# Altium footprint library 辉光_PCBLib.PcbLib: 45 footprints (part 3 of 3)
Each footprint in its own frame and in the unit in brackets; x right, y up, seen from the top. Pads: shape width x height; smd on the part's side, far side on the other; paste and mask are expansions set on the pad; w line width, h text height; cw(c..) or ccw(c..) is an arc to the next point about the centre after c.
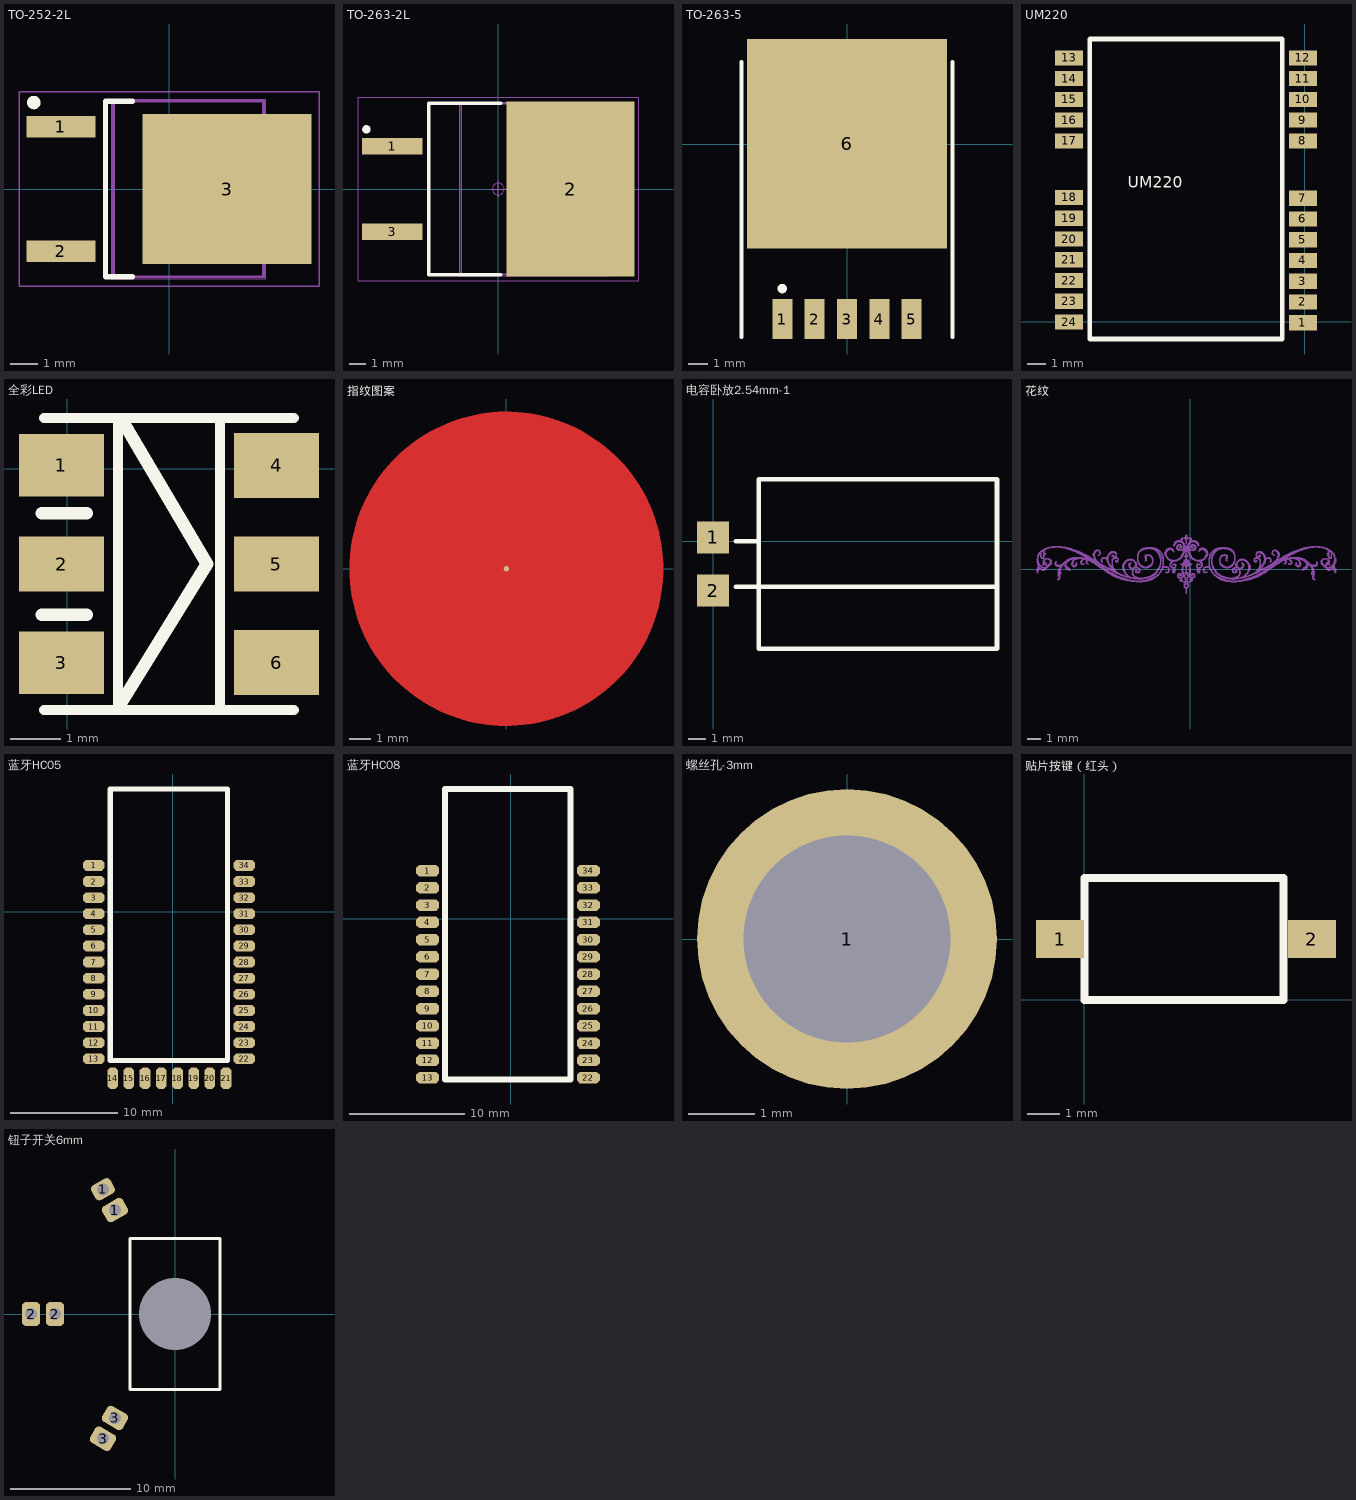
[diagram p2: the footprints below, top view; thin cyan lines are the x and y axes]

## TO-252-2L [mm]
pads (3):
  rect 2.55x0.8 smd: 1(-4,2.3) 2(-4,-2.3)
  rect 6.25x5.55 smd: 3(2.15,0)
Top Overlay:
  circle w0.25: c-5,3.2 r0.125
  lines w0.2: -1.35,-3.25 -2.35,-3.25 -2.35,3.25 -1.35,3.25
Mechanical 15:
  lines w0.1: 3.5,-2.668 3.946,-2.668 4.85,-1.666 4.85,1.666 3.946,2.668 3.5,2.668 ; -2.05,-3.25 3.5,-3.25 3.5,3.25 -2.05,3.25 -2.05,-3.25
Mechanical 16:
  circle w0.05: c0,0 r0.35
  lines w0.001: -2.125,-3.325 3.575,-3.325 3.575,3.325 -2.125,3.325 -2.125,-3.325
  lines w0.05: -0.5,0 0.5,0 ; 0,-0.5 0,0.5 ; -5.55,-3.6 5.55,-3.6 5.55,3.6 -5.55,3.6 -5.55,-3.6

## TO-263-2L [mm]
height 1.4
pads (3):
  rect 3.6x1 smd: 1(-6.3,2.54) 3(-6.3,-2.54)
  rect 7.6x10.4 smd: 2(4.3,0)
Top Overlay:
  circle w0.25: c-7.85,3.55 r0.125
  lines w0.2: 0.15,-5.1 -4.15,-5.1 -4.15,5.1 0.15,5.1
Mechanical 15:
  lines w0.1: 6.49,-5.08 -2.21,-5.08 -2.21,5.08 6.49,5.08 ; 6.49,-5.08 6.49,5.08 ; 6.49,-5.08 6.86,-5.08 7.61,-4.249 7.61,4.249 6.86,5.08 6.49,5.08
Mechanical 16:
  circle w0.05: c0,0 r0.35
  lines w0.001: -2.31,-5.155 6.59,-5.155 6.59,5.155 -2.31,5.155 -2.31,-5.155
  lines w0.05: -0.5,0 0.5,0 ; 0,-0.5 0,0.5 ; -8.35,-5.45 8.35,-5.45 8.35,5.45 -8.35,5.45 -8.35,-5.45

## TO-263-5 [mm]
pads (6):
  rect 1.05x2.1 smd: 1(-3.4,-9.178) 2(-1.7,-9.178) 3(0,-9.178) 4(1.7,-9.178) 5(3.4,-9.178)
  rect 10.5x11 smd: 6(0,0.034)
Top Overlay:
  circle w0.25: c-3.4,-7.578 r0.125
  lines w0.2: -5.55,-10.128 -5.55,4.322 ; 5.55,-10.128 5.55,4.322
3D body: height 0.6, standoff 0, extent 2.921,-9.652 3.81,-5.461
3D body: height 0.6, standoff 0, extent 1.27,-9.652 2.159,-5.461
3D body: height 0.6, standoff 0, extent -0.508,-9.652 0.381,-5.461
3D body: height 0.6, standoff 0, extent -2.159,-9.652 -1.27,-5.461
3D body: height 0.6, standoff 0, extent -3.81,-9.652 -2.921,-5.461
3D body: height 1, standoff 0, extent -5.334,4.318 5.334,5.334
3D body: height 3, standoff 0, extent -5.334,-5.461 5.334,4.318

## UM220 [mm]
pads (24):
  rect 1.5x0.8 smd: 1(-0.092,-0.062) 2(-0.092,1.038) 3(-0.092,2.138) 4(-0.092,3.238) 5(-0.092,4.338) 6(-0.092,5.438) 7(-0.092,6.538) 8(-0.09,9.576) 9(-0.09,10.676) 10(-0.09,11.776) 11(-0.09,12.876) 12(-0.09,13.976) 13(-12.49,13.976) 14(-12.49,12.876) 15(-12.49,11.776) 16(-12.49,10.676) 17(-12.49,9.576) 18(-12.49,6.576) 19(-12.49,5.476) 20(-12.49,4.376) 21(-12.49,3.276) 22(-12.49,2.176) 23(-12.49,1.076) 24(-12.49,-0.024)
Top Overlay:
  lines w0.254: -11.39,-0.924 -1.19,-0.924 -1.19,14.976 -11.39,14.976 -11.39,-0.924
  text "UM220" at -9.39,6.876 h1.02

## 全彩LED [mm]
pads (6):
  rect 1.7x1.25 smd: 1(-0.118,0.07) 3(-0.118,-3.88)
  rect 1.7x1.1 smd: 2(-0.118,-1.905) 5(4.182,-1.905)
  rect 1.7x1.3 smd: 4(4.182,0.07) 6(4.182,-3.88)
Top Overlay:
  lines w0.2: -0.468,-4.826 4.532,-4.826 ; -0.468,1.016 4.532,1.016 ; 1.016,-4.826 1.016,1.016 ; 3.048,-4.699 3.048,1.016
  lines w0.254: -0.508,-2.921 0.381,-2.921 ; -0.508,-0.889 0.381,-0.889 ; 1.086,-4.664 2.794,-1.905 1.143,0.889

## 指纹图案 [mil]
pads (1):
  round 10 smd: 1(0,0)
Top Layer:
  circle w354.33: c0,0 r118.11
Top Solder:
  drawing of 925 lines, arcs and shapes, not listed

## 电容卧放2.54mm-1 [mil] "11.6mmX5.3mm"
pads (2):
  rect 70x70 smd: 1(0,8) 2(0,-108)
Top Overlay:
  lines w10: 50,-100 620,-100 ; 50,0 100,0 ; 100,-235 621.25,-235 621.25,135 100,135 100,-235

## 花纹 [mm]
Top Solder:
  drawing of 1935 lines, arcs and shapes, not listed

## 蓝牙HC05 [mm]
pads (34):
  oct 2x1 smd: 1(-7.366,4.318) 2(-7.366,2.818) 3(-7.366,1.318) 4(-7.366,-0.182) 5(-7.366,-1.682) 6(-7.366,-3.182) 7(-7.366,-4.682) 8(-7.366,-6.182) 9(-7.366,-7.682) 10(-7.366,-9.182) 11(-7.366,-10.682) 12(-7.366,-12.182) 13(-7.366,-13.682) 22(6.634,-13.682) 23(6.634,-12.182) 24(6.634,-10.682) 25(6.634,-9.182) 26(6.634,-7.682) 27(6.634,-6.182) 28(6.634,-4.682) 29(6.634,-3.182) 30(6.634,-1.682) 31(6.634,-0.182) 32(6.634,1.318) 33(6.634,2.818) 34(6.634,4.318)
  oct 1x2 smd: 14(-5.608,-15.494) 15(-4.101,-15.494) 16(-2.594,-15.494) 17(-1.087,-15.494) 18(0.421,-15.494) 19(1.928,-15.494) 20(3.435,-15.494) 21(4.942,-15.494)
Top Overlay:
  lines w0.508: -5.842,-13.843 -5.842,11.43 5.08,11.43 5.08,-13.843 -5.842,-13.843
3D body "User Library-Bluetooth HC-06_.STEP": height 2.35, standoff 0, extent -7.376,-15.442 6.644,12.568

## 蓝牙HC08 [mm]
pads (26):
  oct 2x1 smd: 1(-7.239,4.191) 2(-7.239,2.691) 3(-7.239,1.191) 4(-7.239,-0.309) 5(-7.239,-1.809) 6(-7.239,-3.309) 7(-7.239,-4.809) 8(-7.239,-6.309) 9(-7.239,-7.809) 10(-7.239,-9.309) 11(-7.239,-10.809) 12(-7.239,-12.309) 13(-7.239,-13.809) 22(6.761,-13.809) 23(6.761,-12.309) 24(6.761,-10.809) 25(6.761,-9.309) 26(6.761,-7.809) 27(6.761,-6.309) 28(6.761,-4.809) 29(6.761,-3.309) 30(6.761,-1.809) 31(6.761,-0.309) 32(6.761,1.191) 33(6.761,2.691) 34(6.761,4.191)
Top Overlay:
  lines w0.508: -5.715,-13.97 5.207,-13.97 5.207,11.303 -5.715,11.303 -5.715,-13.97
3D body "User Library-Bluetooth HC-06_.STEP": height 2.35, standoff 0, extent -7.249,-15.569 6.771,12.441

## 螺丝孔-3mm [mm]
pads (1):
  round 4.5 hole 3.1: 1(0,0)

## 贴片按键（红头） [mm]
pads (2):
  rect 1.5x1.2 smd: 1(-0.762,1.905) 2(7.112,1.905)
Top Overlay:
  lines w0.254: 0,0 0,3.81 6.223,3.81 6.223,0 0,0

## 钮子开关6mm [mm]
pads (7):
  rrect50% 1.8x1.4 hole 1 rot 30: 1(-6,10.392)
  rrect50% 2x1.524 hole 1 rot 30: 1(-5,8.66)
  rrect50% 1.524x2 hole 1: 2(-12,0) 2(-10,0)
  rrect50% 2x1.524 hole 1 rot 150: 3(-6,-10.392) 3(-5,-8.66)
  round 0 hole 6 unplated: 4(0,0)
Top Overlay:
  lines w0.254: -3.75,-6.275 -3.75,6.275 3.75,6.275 3.75,-6.275 -3.75,-6.275
Bottom Solder:
  lines w0.254: -6,-10.392 cw(c0,0) -6,10.392 ; -5,-8.66 cw(c0,0) -5,8.66